# Altium footprint library heromap.PcbLib: 593 footprints (part 3 of 38)
Each footprint in its own frame and in the unit in brackets; x right, y up, seen from the top. Pads: shape width x height; smd on the part's side, far side on the other; paste and mask are expansions set on the pad; w line width, h text height; cw(c..) or ccw(c..) is an arc to the next point about the centre after c.
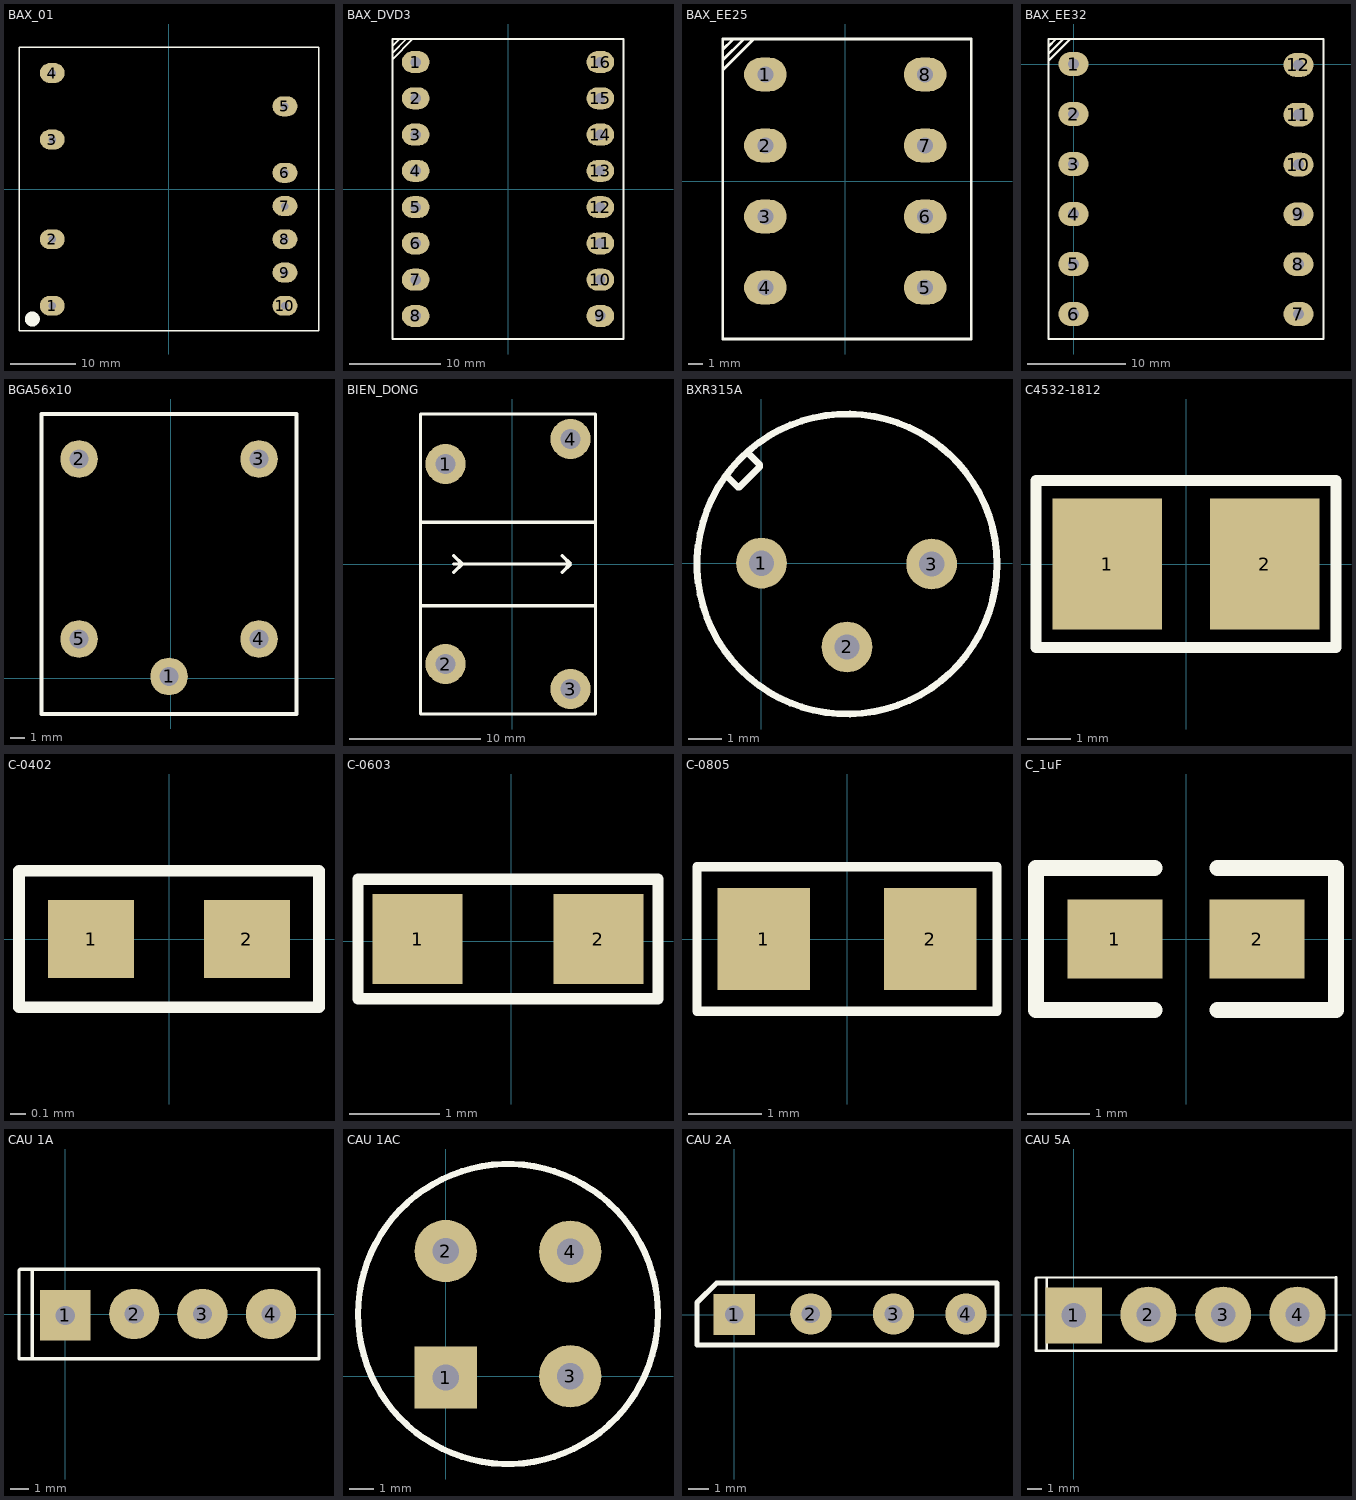
[diagram p2: the footprints below, top view; thin cyan lines are the x and y axes]

## BAX_01 [mil] "Bien ap xung cho nguon T9AT"
pads (10):
  oval 150x120 hole 45: 1(-700,-700) 2(-700,-300) 3(-700,300) 4(-700,700) 5(700,500) 6(700,100) 7(700,-100) 8(700,-300) 9(700,-500) 10(700,-700)
Top Overlay:
  circle w50: c-820,-780 r20
  lines w8: -900,-850 905,-850 905,855 -900,855 -900,-850

## BAX_DVD3 [mil] "Bien ap xung DVD3"
pads (16):
  oval 120x95 hole 45: 1(-400,550) 2(-400,392.86) 3(-400,235.71) 4(-400,78.57) 5(-400,-78.57) 6(-400,-235.71) 7(-400,-392.86) 8(-400,-550) 9(400,-550) 10(400,-392.86) 11(400,-235.71) 12(400,-78.57) 13(400,78.57) 14(400,235.71) 15(400,392.86) 16(400,550)
Top Overlay:
  lines w8: -500,563 -414,649 ; -500,589 -500,591 -442,649 ; -500,618 -500,620 -471,649 ; -500,-650 500,-650 500,650 490,650 -500,650 -500,-650

## BAX_EE25 [mil] "EE25"
pads (8):
  oval 120x95 hole 45: 1(-225,300) 2(-225,100) 3(-225,-100) 4(-225,-300) 5(225,-300) 6(225,-100) 7(225,100) 8(225,300)
Top Overlay:
  lines w8: -345,313 -259,399 ; -345,339 -345,341 -287,399 ; -345,368 -345,370 -316,399 ; -345,-445 355,-445 355,400 -345,400 -345,-445

## BAX_EE32 [mil] "EE32"
pads (12):
  oval 120x95 hole 45: 1(0,0) 2(0,-200) 3(0,-400) 4(0,-600) 5(0,-800) 6(0,-1000) 7(900,-1000) 8(900,-800.71) 9(900,-601.43) 10(900,-402.14) 11(900,-202.86) 12(900,-3.57)
Top Overlay:
  lines w8: -100,13 -14,99 ; -100,39 -100,41 -42,99 ; -100,68 -100,70 -71,99 ; -100,-1100 1000,-1100 1000,100 -100,100 -100,-1100

## BGA56x10 [mil]
pads (5):
  round 100 hole 50: 1(-4,5) 2(-244,585) 3(236,585) 4(236,105) 5(-244,105)
Top Overlay:
  lines w10: -344,-95 -344,705 336,705 336,-95 -344,-95

## BIEN_DONG [mil]
pads (4):
  round 120 hole 60: 1(-200,300) 2(-200,-300) 3(175,-375) 4(175,375)
Top Overlay:
  lines w8: -275,-450 -275,425 -275,450 250,450 250,-450 -275,-450
  lines w10: -275,-125 250,-125 ; -275,125 250,125 ; -175,-25 -150,0 -175,25 ; -175,0 175,0 ; 150,-25 175,0 ; 150,25 175,0
3D body: height 896.45, standoff 0, extent -275,-450 250,448.22
3D body: height 450, standoff 0, extent -275,-450 250,448.22

## BXR315A [mil] "Xtal for RF"
pads (3):
  round 60 hole 30: 1(0,0) 2(101,-99) 3(201,-1)
Top Overlay:
  circle w8: c101,-1 r177.17
  lines w8: -41,103 -28,90 -26,90 -2,114 -2,116 -15,129

## C4532-1812 [mm]
pads (2):
  rect 2.5x3 smd: 1(-1.8,0) 2(1.8,0)
Top Overlay:
  lines w0.254: -3.429,-1.905 -3.429,1.905 3.429,1.905 3.429,-1.905 -3.429,-1.905
3D body: height 2.5, standoff 0, extent -1.905,-1.524 1.905,1.524
3D body: height 2.5, standoff 0, extent -2.286,-1.524 -1.905,1.524
3D body: height 2.5, standoff 0, extent 1.905,-1.524 2.286,1.524

## C-0402 [mil]
pads (2):
  rect 22x20 smd: 1(-20,0) 2(20,0)
Top Overlay:
  lines w3: -38.5,-17.5 38.5,-17.5 38.5,17.5 -38.5,17.5 -38.5,-17.5
3D body "User Library-cap_0402.STEP": height 19.68, standoff 0, extent -19.68,-9.84 19.69,9.85

## C-0603 [mm] "Chip Capacitor; Body 1.6 x 0.8 mm (LxW typ)"
height 0.87
pads (2):
  rect 1x1 smd: 1(-1.041,0.025) 2(0.965,0.025)
Top Overlay:
  lines w0.127: -1.702,-0.635 1.626,-0.635 1.626,0.686 -1.702,0.686 -1.702,-0.635
3D body "User Library-SMD CAPACITOR.STEP": height 0.8, standoff 0, extent -0.822,-0.376 0.778,0.424

## C-0805 [mil] "Compoment SMD 80x50mil"
height 50
pads (2):
  rect 50x55 smd: 1(-45,0) 2(45,0)
Top Overlay:
  lines w5: -81,-39 -81,39 81,39 81,-39 -81,-39
3D body "SW3dPS-smt_resistor_packages.STEP": height 24.02, standoff -0.39, extent -39.76,-25 39.76,25

## C_1uF [mil]
pads (2):
  rect 60x50 smd: 1(-45,0) 2(45,0)
Top Overlay:
  lines w10: -20,-45 -95,-45 -95,45 -20,45 ; 20,-45 95,-45 95,45 20,45
3D body: height 51.18, standoff 0, extent 25,-25 45,25
3D body: height 51.18, standoff 0, extent -45,-25 -25,25
3D body: height 51.18, standoff 0, extent -25,-25 25,25

## CAU 1A [mil] "CAU 1A DET"
height 800
pads (4):
  rect 110x110 hole 42: 1(0,-2)
  round 110 hole 42: 2(151,1) 3(300,1) 4(450,1)
Top Overlay:
  lines w7: -72,-95 -72,99 ; -101,-97 555,-97 555,99 -99,99 -101,97 -101,-97
3D body "SW3dPS-KBPM.STEP": height 502.76, standoff -450, extent -61.99,-87.24 511.99,110

## CAU 1AC [mil] "CAU 1A TRON"
height 800
pads (4):
  rect 100x100 hole 42: 1(0,-2)
  round 100 hole 42: 2(0,201) 3(200,0) 4(200,200)
Top Overlay:
  circle w10: c100,100 r240.88

## CAU 2A [mil]
pads (4):
  rect 80x80 hole 35: 1(0,0)
  round 80 hole 35: 2(148,1) 3(308,1) 4(448,1)
Top Overlay:
  lines w10: -72,-59 -72,23 -34,61 448,61 508,61 508,-59 -72,-59

## CAU 5A [mil] "CAU 5A DET"
height 800
pads (4):
  rect 150x150 hole 65: 1(0,-2)
  round 150 hole 65: 2(200,0) 3(400,0) 4(599,0)
Top Overlay:
  lines w7: -72,-95 -72,99 ; -101,-97 -101,97 -99,99 702,100 702,-97 -101,-97
3D body "SW3dPS-bridge 2.STEP": height 940.16, standoff -502.14, extent -133.98,-85 743.98,63.03